# Altium schematic symbol library Capacitor - Aluminium TH.SchLib: 4591 symbols (part 16 of 27)
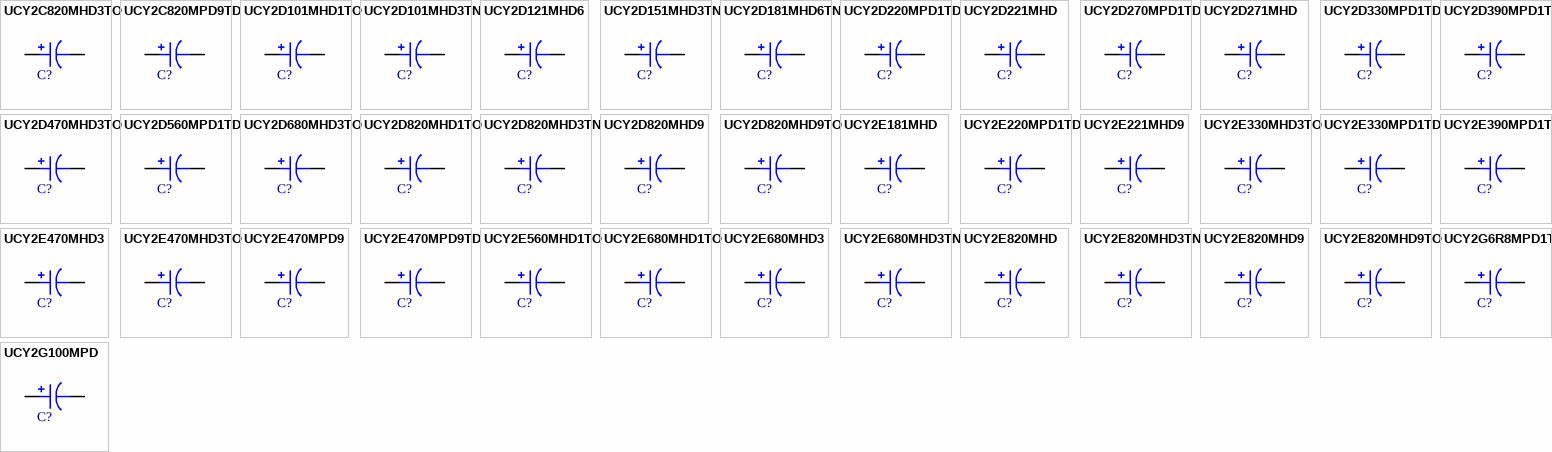
[diagram p129: symbols UCY2C820MHD3TO to UCY2G100MPD]

## UCY2D220MPD1TD
designator C?, comment 22uF  (value not drawn)
CAP ALUM 22UF 20% 200V RADIAL; Part Number: UCY2D220MPD1TD; Manufacturer: Nichicon; TemperatureRange: -40C ~ 105C; Type: Polar; Ripple Current: 225mA @ 120Hz; Value: 22uF; PartId: 25098; Supplier 1: Digi-Key; Supplier Part Number 1: 493-4803-3-ND; ComponentLink1Description: Datasheet; ComponentLink1URL: http://nichicon-us.com/english/products/pdfs/e-ucy.pdf; ComponentLink2Description: Digi-Key Listing; ComponentLink2URL: https://www.digikey.com/product-detail/en/nichicon/UCY2D220MPD1TD/493-4803-3-ND/3129808; Tolerance: 20%; Voltage: 200V; Price: 0.2793; Device Package: Radial, Can, 10mm
footprint CAP AL TH D10 L5 H17.5
pins: 1, 2

## UCY2D221MHD
designator C?, comment 220uF  (value not drawn)
CAP ALUM 220UF 20% 200V RADIAL; Part Number: UCY2D221MHD; Manufacturer: Nichicon; TemperatureRange: -40C ~ 105C; Type: Polar; Ripple Current: 1.23A @ 120Hz; Value: 220uF; PartId: 27200; Supplier 1: Digi-Key; Supplier Part Number 1: 493-5454-ND; ComponentLink1Description: Datasheet; ComponentLink1URL: http://nichicon-us.com/english/products/pdfs/e-ucy.pdf; ComponentLink2Description: Digi-Key Listing; ComponentLink2URL: https://www.digikey.com/product-detail/en/nichicon/UCY2D221MHD/493-5454-ND/2597700; Tolerance: 20%; Voltage: 200V; Price: 2.09; Device Package: Radial, Can, 16mm
footprint CAP AL TH D16 L7.5 H33.5
pins: 1, 2

## UCY2D270MPD1TD
designator C?, comment 27uF  (value not drawn)
CAP ALUM 27UF 20% 200V RADIAL; Part Number: UCY2D270MPD1TD; Manufacturer: Nichicon; TemperatureRange: -40C ~ 105C; Type: Polar; Ripple Current: 235mA @ 120Hz; Value: 27uF; PartId: 25108; Supplier 1: Digi-Key; Supplier Part Number 1: 493-4805-3-ND; ComponentLink1Description: Datasheet; ComponentLink1URL: http://nichicon-us.com/english/products/pdfs/e-ucy.pdf; ComponentLink2Description: Digi-Key Listing; ComponentLink2URL: https://www.digikey.com/product-detail/en/nichicon/UCY2D270MPD1TD/493-4805-3-ND/3129810; Tolerance: 20%; Voltage: 200V; Price: 0.2956; Device Package: Radial, Can, 10mm
footprint CAP AL TH D10 L5 H17.5
pins: 1, 2

## UCY2D271MHD
designator C?, comment 270uF  (value not drawn)
CAP ALUM 270UF 20% 200V RADIAL; Part Number: UCY2D271MHD; Manufacturer: Nichicon; TemperatureRange: -40C ~ 105C; Type: Polar; Ripple Current: 1.4A @ 120Hz; Value: 270uF; PartId: 27415; Supplier 1: Digi-Key; Supplier Part Number 1: 493-5455-ND; ComponentLink1Description: Datasheet; ComponentLink1URL: http://nichicon-us.com/english/products/pdfs/e-ucy.pdf; ComponentLink2Description: Digi-Key Listing; ComponentLink2URL: https://www.digikey.com/product-detail/en/nichicon/UCY2D271MHD/493-5455-ND/2597703; Tolerance: 20%; Voltage: 200V; Price: 2.51; Device Package: Radial, Can, 16mm
footprint CAP AL TH D16 L7.5 H37
pins: 1, 2

## UCY2D330MPD1TD
designator C?, comment 33uF  (value not drawn)
CAP ALUM 33UF 20% 200V RADIAL; Part Number: UCY2D330MPD1TD; Manufacturer: Nichicon; TemperatureRange: -40C ~ 105C; Type: Polar; Ripple Current: 305mA @ 120Hz; Value: 33uF; PartId: 25483; Supplier 1: Digi-Key; Supplier Part Number 1: 493-4806-3-ND; ComponentLink1Description: Datasheet; ComponentLink1URL: http://nichicon-us.com/english/products/pdfs/e-ucy.pdf; ComponentLink2Description: Digi-Key Listing; ComponentLink2URL: https://www.digikey.com/product-detail/en/nichicon/UCY2D330MPD1TD/493-4806-3-ND/3129811; Tolerance: 20%; Voltage: 200V; Price: 0.3332; Device Package: Radial, Can, 10mm
footprint CAP AL TH D10 L5 H22
pins: 1, 2

## UCY2D390MPD1TD
designator C?, comment 39uF  (value not drawn)
CAP ALUM 39UF 20% 200V RADIAL; Part Number: UCY2D390MPD1TD; Manufacturer: Nichicon; TemperatureRange: -40C ~ 105C; Type: Polar; Ripple Current: 325mA @ 120Hz; Value: 39uF; PartId: 25485; Supplier 1: Digi-Key; Supplier Part Number 1: 493-4807-3-ND; ComponentLink1Description: Datasheet; ComponentLink1URL: http://nichicon-us.com/english/products/pdfs/e-ucy.pdf; ComponentLink2Description: Digi-Key Listing; ComponentLink2URL: https://www.digikey.com/product-detail/en/nichicon/UCY2D390MPD1TD/493-4807-3-ND/3129812; Tolerance: 20%; Voltage: 200V; Price: 0.3411; Device Package: Radial, Can, 10mm
footprint CAP AL TH D10 L5 H22
pins: 1, 2

## UCY2D470MHD3TO
designator C?, comment 47uF  (value not drawn)
CAP ALUM 47UF 20% 200V RADIAL; Part Number: UCY2D470MHD3TO; Manufacturer: Nichicon; TemperatureRange: -40C ~ 105C; Type: Polar; Ripple Current: 490mA; Value: 47uF; PartId: 23033; Supplier 1: Digi-Key; Supplier Part Number 1: 493-4808-1-ND; ComponentLink1Description: Datasheet; ComponentLink1URL: http://nichicon-us.com/english/products/pdfs/e-ucy.pdf; ComponentLink2Description: Digi-Key Listing; ComponentLink2URL: https://www.digikey.com/product-detail/en/nichicon/UCY2D470MHD3TO/493-4808-1-ND/3129145; Tolerance: 20%; Voltage: 200V; Price: 0; Device Package: Radial, Can, 12.5mm
footprint CAP AL TH D12.5 L5 H21.5
pins: 1, 2

## UCY2D560MPD1TD
designator C?, comment 56uF  (value not drawn)
CAP ALUM 56UF 20% 200V RADIAL; Part Number: UCY2D560MPD1TD; Manufacturer: Nichicon; TemperatureRange: -40C ~ 105C; Type: Polar; Ripple Current: 415mA @ 120Hz; Value: 56uF; PartId: 26027; Supplier 1: Digi-Key; Supplier Part Number 1: 493-4809-3-ND; ComponentLink1Description: Datasheet; ComponentLink1URL: http://nichicon-us.com/english/products/pdfs/e-ucy.pdf; ComponentLink2Description: Digi-Key Listing; ComponentLink2URL: https://www.digikey.com/product-detail/en/nichicon/UCY2D560MPD1TD/493-4809-3-ND/3129814; Tolerance: 20%; Voltage: 200V; Price: 0.4253; Device Package: Radial, Can, 10mm
footprint CAP AL TH D10 L5 H30
pins: 1, 2

## UCY2D680MHD3TO
designator C?, comment 68uF  (value not drawn)
CAP ALUM 68UF 20% 200V RADIAL; Part Number: UCY2D680MHD3TO; Manufacturer: Nichicon; TemperatureRange: -40C ~ 105C; Type: Polar; Ripple Current: 650mA; Value: 68uF; PartId: 23035; Supplier 1: Digi-Key; Supplier Part Number 1: 493-4810-1-ND; ComponentLink1Description: Datasheet; ComponentLink1URL: http://nichicon-us.com/english/products/pdfs/e-ucy.pdf; ComponentLink2Description: Digi-Key Listing; ComponentLink2URL: https://www.digikey.com/product-detail/en/nichicon/UCY2D680MHD3TO/493-4810-1-ND/3129147; Tolerance: 20%; Voltage: 200V; Price: 0; Device Package: Radial, Can, 12.5mm
footprint CAP AL TH D12.5 L5 H21.5
pins: 1, 2

## UCY2D820MHD1TO
designator C?, comment 82uF  (value not drawn)
CAP ALUM 82UF 20% 200V RADIAL; Part Number: UCY2D820MHD1TO; Manufacturer: Nichicon; TemperatureRange: -40C ~ 105C; Type: Polar; Ripple Current: 645mA @ 120Hz; Value: 82uF; PartId: 23639; Supplier 1: Digi-Key; Supplier Part Number 1: 493-4811-3-ND; ComponentLink1Description: Datasheet; ComponentLink1URL: http://nichicon-us.com/english/products/pdfs/e-ucy.pdf; ComponentLink2Description: Digi-Key Listing; ComponentLink2URL: https://www.digikey.com/product-detail/en/nichicon/UCY2D820MHD1TO/493-4811-3-ND/3129816; Tolerance: 20%; Voltage: 200V; Price: 0.5819; Device Package: Radial, Can, 12.5mm
footprint CAP AL TH D12.5 L5 H26.5
pins: 1, 2

## UCY2D820MHD3TN
designator C?, comment 82uF  (value not drawn)
CAP ALUM 82UF 20% 200V RADIAL; Part Number: UCY2D820MHD3TN; Manufacturer: Nichicon; TemperatureRange: -40C ~ 105C; Type: Polar; Ripple Current: 690mA @ 120Hz; Value: 82uF; PartId: 26381; Supplier 1: Digi-Key; Supplier Part Number 1: 493-4812-3-ND; ComponentLink1Description: Datasheet; ComponentLink1URL: http://nichicon-us.com/english/products/pdfs/e-ucy.pdf; ComponentLink2Description: Digi-Key Listing; ComponentLink2URL: https://www.digikey.com/product-detail/en/nichicon/UCY2D820MHD3TN/493-4812-3-ND/3129817; Tolerance: 20%; Voltage: 200V; Price: 0.763; Device Package: Radial, Can, 16mm
footprint CAP AL TH D16 L7.5 H22
pins: 1, 2

## UCY2D820MHD9
designator C?, comment 82uF  (value not drawn)
CAP ALUM 82UF 20% 200V RADIAL; Part Number: UCY2D820MHD9; Manufacturer: Nichicon; TemperatureRange: -40C ~ 105C; Type: Polar; Ripple Current: 645mA @ 120Hz; Value: 82uF; PartId: 23034; Supplier 1: Digi-Key; Supplier Part Number 1: 493-6833-ND; ComponentLink1Description: Datasheet; ComponentLink1URL: http://nichicon-us.com/english/products/pdfs/e-ucy.pdf; ComponentLink2Description: Digi-Key Listing; ComponentLink2URL: https://www.digikey.com/product-detail/en/nichicon/UCY2D820MHD9/493-6833-ND/3664418; Tolerance: 20%; Voltage: 200V; Price: 0; Device Package: Radial, Can, 12.5mm
footprint CAP AL TH D12.5 L5 H21.5
pins: 1, 2

## UCY2D820MHD9TO
designator C?, comment 82uF  (value not drawn)
CAP ALUM 82UF 20% 200V RADIAL; Part Number: UCY2D820MHD9TO; Manufacturer: Nichicon; TemperatureRange: -40C ~ 105C; Type: Polar; Ripple Current: 645mA; Value: 82uF; PartId: 23048; Supplier 1: Digi-Key; Supplier Part Number 1: 493-13307-1-ND; ComponentLink1Description: Datasheet; ComponentLink1URL: http://nichicon-us.com/english/products/pdfs/e-ucy.pdf; ComponentLink2Description: Digi-Key Listing; ComponentLink2URL: https://www.digikey.com/product-detail/en/nichicon/UCY2D820MHD9TO/493-13307-1-ND/4333063; Tolerance: 20%; Voltage: 200V; Price: 0; Device Package: Radial, Can, 12.5mm
footprint CAP AL TH D12.5 L5 H21.5
pins: 1, 2

## UCY2E181MHD
designator C?, comment 180uF  (value not drawn)
CAP ALUM 180UF 20% 250V RADIAL; Part Number: UCY2E181MHD; Manufacturer: Nichicon; TemperatureRange: -40C ~ 105C; Type: Polar; Ripple Current: 1.11A @ 120Hz; Value: 180uF; PartId: 27242; Supplier 1: Digi-Key; Supplier Part Number 1: 493-13073-ND; ComponentLink1Description: Datasheet; ComponentLink1URL: http://nichicon-us.com/english/products/pdfs/e-ucy.pdf; ComponentLink2Description: Digi-Key Listing; ComponentLink2URL: https://www.digikey.com/product-detail/en/nichicon/UCY2E181MHD/493-13073-ND/2597722; Tolerance: 20%; Voltage: 250V; Price: 2.55; Device Package: Radial, Can, 16mm
footprint CAP AL TH D16 L7.5 H33.5
pins: 1, 2

## UCY2E220MPD1TD
designator C?, comment 22uF  (value not drawn)
CAP ALUM 22UF 20% 250V RADIAL; Part Number: UCY2E220MPD1TD; Manufacturer: Nichicon; TemperatureRange: -40C ~ 105C; Type: Polar; Ripple Current: 225mA @ 120Hz; Value: 22uF; PartId: 25110; Supplier 1: Digi-Key; Supplier Part Number 1: 493-13310-3-ND; ComponentLink1Description: Datasheet; ComponentLink1URL: http://nichicon-us.com/english/products/pdfs/e-ucy.pdf; ComponentLink2Description: Digi-Key Listing; ComponentLink2URL: https://www.digikey.com/product-detail/en/nichicon/UCY2E220MPD1TD/493-13310-3-ND/4332941; Tolerance: 20%; Voltage: 250V; Price: 0.3036; Device Package: Radial, Can, 10mm
footprint CAP AL TH D10 L5 H17.5
pins: 1, 2

## UCY2E221MHD9
designator C?, comment 220uF  (value not drawn)
CAP ALUM 220UF 20% 250V RADIAL; Part Number: UCY2E221MHD9; Manufacturer: Nichicon; TemperatureRange: -40C ~ 105C; Type: Polar; Ripple Current: 1.22A @ 120Hz; Value: 220uF; PartId: 27430; Supplier 1: Digi-Key; Supplier Part Number 1: 493-6855-ND; ComponentLink1Description: Datasheet; ComponentLink1URL: http://nichicon-us.com/english/products/pdfs/e-ucy.pdf; ComponentLink2Description: Digi-Key Listing; ComponentLink2URL: https://www.digikey.com/product-detail/en/nichicon/UCY2E221MHD9/493-6855-ND/3664454; Tolerance: 20%; Voltage: 250V; Price: 3.12; Device Package: Radial, Can, 16mm
footprint CAP AL TH D16 L7.5 H37
pins: 1, 2

## UCY2E330MHD3TO
designator C?, comment 33uF  (value not drawn)
CAP ALUM 33UF 20% 250V RADIAL; Part Number: UCY2E330MHD3TO; Manufacturer: Nichicon; TemperatureRange: -40C ~ 105C; Type: Polar; Ripple Current: 400mA; Value: 33uF; PartId: 23027; Supplier 1: Digi-Key; Supplier Part Number 1: 493-4816-1-ND; ComponentLink1Description: Datasheet; ComponentLink1URL: http://nichicon-us.com/english/products/pdfs/e-ucy.pdf; ComponentLink2Description: Digi-Key Listing; ComponentLink2URL: https://www.digikey.com/product-detail/en/nichicon/UCY2E330MHD3TO/493-4816-1-ND/3129153; Tolerance: 20%; Voltage: 250V; Price: 0; Device Package: Radial, Can, 12.5mm
footprint CAP AL TH D12.5 L5 H21.5
pins: 1, 2

## UCY2E330MPD1TD
designator C?, comment 33uF  (value not drawn)
CAP ALUM 33UF 20% 250V RADIAL; Part Number: UCY2E330MPD1TD; Manufacturer: Nichicon; TemperatureRange: -40C ~ 105C; Type: Polar; Ripple Current: 305mA @ 120Hz; Value: 33uF; PartId: 25486; Supplier 1: Digi-Key; Supplier Part Number 1: 493-4817-3-ND; ComponentLink1Description: Datasheet; ComponentLink1URL: http://nichicon-us.com/english/products/pdfs/e-ucy.pdf; ComponentLink2Description: Digi-Key Listing; ComponentLink2URL: https://www.digikey.com/product-detail/en/nichicon/UCY2E330MPD1TD/493-4817-3-ND/3129822; Tolerance: 20%; Voltage: 250V; Price: 0.3495; Device Package: Radial, Can, 10mm
footprint CAP AL TH D10 L5 H22
pins: 1, 2

## UCY2E390MPD1TD
designator C?, comment 39uF  (value not drawn)
CAP ALUM 39UF 20% 250V RADIAL; Part Number: UCY2E390MPD1TD; Manufacturer: Nichicon; TemperatureRange: -40C ~ 105C; Type: Polar; Ripple Current: 345mA @ 120Hz; Value: 39uF; PartId: 26029; Supplier 1: Digi-Key; Supplier Part Number 1: 493-4818-3-ND; ComponentLink1Description: Datasheet; ComponentLink1URL: http://nichicon-us.com/english/products/pdfs/e-ucy.pdf; ComponentLink2Description: Digi-Key Listing; ComponentLink2URL: https://www.digikey.com/product-detail/en/nichicon/UCY2E390MPD1TD/493-4818-3-ND/3129823; Tolerance: 20%; Voltage: 250V; Price: 0.441; Device Package: Radial, Can, 10mm
footprint CAP AL TH D10 L5 H30
pins: 1, 2

## UCY2E470MHD3
designator C?, comment 47uF  (value not drawn)
CAP ALUM 47UF 20% 250V RADIAL; Part Number: UCY2E470MHD3; Manufacturer: Nichicon; TemperatureRange: -40C ~ 105C; Type: Polar; Ripple Current: 490mA @ 120Hz; Value: 47uF; PartId: 23031; Supplier 1: Digi-Key; Supplier Part Number 1: 493-14381-ND; ComponentLink1Description: Datasheet; ComponentLink1URL: http://nichicon-us.com/english/products/pdfs/e-ucy.pdf; ComponentLink2Description: Digi-Key Listing; ComponentLink2URL: https://www.digikey.com/product-detail/en/nichicon/UCY2E470MHD3/493-14381-ND/2539807; Tolerance: 20%; Voltage: 250V; Price: 0; Device Package: Radial, Can, 12.5mm
footprint CAP AL TH D12.5 L5 H21.5
pins: 1, 2

## UCY2E470MHD3TO
designator C?, comment 47uF  (value not drawn)
CAP ALUM 47UF 20% 250V RADIAL; Part Number: UCY2E470MHD3TO; Manufacturer: Nichicon; TemperatureRange: -40C ~ 105C; Type: Polar; Ripple Current: 490mA; Value: 47uF; PartId: 23043; Supplier 1: Digi-Key; Supplier Part Number 1: 493-4819-1-ND; ComponentLink1Description: Datasheet; ComponentLink1URL: http://nichicon-us.com/english/products/pdfs/e-ucy.pdf; ComponentLink2Description: Digi-Key Listing; ComponentLink2URL: https://www.digikey.com/product-detail/en/nichicon/UCY2E470MHD3TO/493-4819-1-ND/3129156; Tolerance: 20%; Voltage: 250V; Price: 0; Device Package: Radial, Can, 12.5mm
footprint CAP AL TH D12.5 L5 H21.5
pins: 1, 2

## UCY2E470MPD9
designator C?, comment 47uF  (value not drawn)
CAP ALUM 47UF 20% 250V RADIAL; Part Number: UCY2E470MPD9; Manufacturer: Nichicon; TemperatureRange: -40C ~ 105C; Type: Polar; Ripple Current: 345mA @ 120Hz; Value: 47uF; PartId: 26182; Supplier 1: Digi-Key; Supplier Part Number 1: 493-6919-ND; ComponentLink1Description: Datasheet; ComponentLink1URL: http://nichicon-us.com/english/products/pdfs/e-ucy.pdf; ComponentLink2Description: Digi-Key Listing; ComponentLink2URL: https://www.digikey.com/product-detail/en/nichicon/UCY2E470MPD9/493-6919-ND/3664437; Tolerance: 20%; Voltage: 250V; Price: 1.01; Device Package: Radial, Can, 10mm
footprint CAP AL TH D10 L5 H30
pins: 1, 2

## UCY2E470MPD9TD
designator C?, comment 47uF  (value not drawn)
CAP ALUM 47UF 20% 250V RADIAL; Part Number: UCY2E470MPD9TD; Manufacturer: Nichicon; TemperatureRange: -40C ~ 105C; Type: Polar; Ripple Current: 345mA @ 120Hz; Value: 47uF; PartId: 26034; Supplier 1: Digi-Key; Supplier Part Number 1: 493-13093-3-ND; ComponentLink1Description: Datasheet; ComponentLink1URL: http://nichicon-us.com/english/products/pdfs/e-ucy.pdf; ComponentLink2Description: Digi-Key Listing; ComponentLink2URL: https://www.digikey.com/product-detail/en/nichicon/UCY2E470MPD9TD/493-13093-3-ND/4332724; Tolerance: 20%; Voltage: 250V; Price: 0.4522; Device Package: Radial, Can, 10mm
footprint CAP AL TH D10 L5 H30
pins: 1, 2

## UCY2E560MHD1TO
designator C?, comment 56uF  (value not drawn)
CAP ALUM 56UF 20% 250V RADIAL; Part Number: UCY2E560MHD1TO; Manufacturer: Nichicon; TemperatureRange: -40C ~ 105C; Type: Polar; Ripple Current: 515mA; Value: 56uF; PartId: 23052; Supplier 1: Digi-Key; Supplier Part Number 1: 493-4820-1-ND; ComponentLink1Description: Datasheet; ComponentLink1URL: http://nichicon-us.com/english/products/pdfs/e-ucy.pdf; ComponentLink2Description: Digi-Key Listing; ComponentLink2URL: https://www.digikey.com/product-detail/en/nichicon/UCY2E560MHD1TO/493-4820-1-ND/3129157; Tolerance: 20%; Voltage: 250V; Price: 0; Device Package: Radial, Can, 12.5mm
footprint CAP AL TH D12.5 L5 H21.5
pins: 1, 2

## UCY2E680MHD1TO
designator C?, comment 68uF  (value not drawn)
CAP ALUM 68UF 20% 250V RADIAL; Part Number: UCY2E680MHD1TO; Manufacturer: Nichicon; TemperatureRange: -40C ~ 105C; Type: Polar; Ripple Current: 615mA @ 120Hz; Value: 68uF; PartId: 23640; Supplier 1: Digi-Key; Supplier Part Number 1: 493-4821-3-ND; ComponentLink1Description: Datasheet; ComponentLink1URL: http://nichicon-us.com/english/products/pdfs/e-ucy.pdf; ComponentLink2Description: Digi-Key Listing; ComponentLink2URL: https://www.digikey.com/product-detail/en/nichicon/UCY2E680MHD1TO/493-4821-3-ND/3129826; Tolerance: 20%; Voltage: 250V; Price: 0.6082; Device Package: Radial, Can, 12.5mm
footprint CAP AL TH D12.5 L5 H26.5
pins: 1, 2

## UCY2E680MHD3
designator C?, comment 68uF  (value not drawn)
CAP ALUM 68UF 20% 250V RADIAL; Part Number: UCY2E680MHD3; Manufacturer: Nichicon; TemperatureRange: -40C ~ 105C; Type: Polar; Ripple Current: 650mA @ 120Hz; Value: 68uF; PartId: 26467; Supplier 1: Digi-Key; Supplier Part Number 1: 493-5932-ND; ComponentLink1Description: Datasheet; ComponentLink1URL: http://nichicon-us.com/english/products/pdfs/e-ucy.pdf; ComponentLink2Description: Digi-Key Listing; ComponentLink2URL: https://www.digikey.com/product-detail/en/nichicon/UCY2E680MHD3/493-5932-ND/2539808; Tolerance: 20%; Voltage: 250V; Price: 1.56; Device Package: Radial, Can, 16mm
footprint CAP AL TH D16 L7.5 H22
pins: 1, 2

## UCY2E680MHD3TN
designator C?, comment 68uF  (value not drawn)
CAP ALUM 68UF 20% 250V RADIAL; Part Number: UCY2E680MHD3TN; Manufacturer: Nichicon; TemperatureRange: -40C ~ 105C; Type: Polar; Ripple Current: 650mA @ 120Hz; Value: 68uF; PartId: 26390; Supplier 1: Digi-Key; Supplier Part Number 1: 493-4822-3-ND; ComponentLink1Description: Datasheet; ComponentLink1URL: http://nichicon-us.com/english/products/pdfs/e-ucy.pdf; ComponentLink2Description: Digi-Key Listing; ComponentLink2URL: https://www.digikey.com/product-detail/en/nichicon/UCY2E680MHD3TN/493-4822-3-ND/3129827; Tolerance: 20%; Voltage: 250V; Price: 0.8188; Device Package: Radial, Can, 16mm
footprint CAP AL TH D16 L7.5 H22
pins: 1, 2

## UCY2E820MHD
designator C?, comment 82uF  (value not drawn)
CAP ALUM 82UF 20% 250V RADIAL; Part Number: UCY2E820MHD; Manufacturer: Nichicon; TemperatureRange: -40C ~ 105C; Type: Polar; Ripple Current: 715mA @ 120Hz; Value: 82uF; PartId: 24374; Supplier 1: Digi-Key; Supplier Part Number 1: 493-5464-ND; ComponentLink1Description: Datasheet; ComponentLink1URL: http://nichicon-us.com/english/products/pdfs/e-ucy.pdf; ComponentLink2Description: Digi-Key Listing; ComponentLink2URL: https://www.digikey.com/product-detail/en/nichicon/UCY2E820MHD/493-5464-ND/2597734; Tolerance: 20%; Voltage: 250V; Price: 1.62; Device Package: Radial, Can, 12.5mm
footprint CAP AL TH D12.5 L5 H35.5
pins: 1, 2

## UCY2E820MHD3TN
designator C?, comment 82uF  (value not drawn)
CAP ALUM 82UF 20% 250V RADIAL; Part Number: UCY2E820MHD3TN; Manufacturer: Nichicon; TemperatureRange: -40C ~ 105C; Type: Polar; Ripple Current: 690mA @ 120Hz; Value: 82uF; PartId: 26396; Supplier 1: Digi-Key; Supplier Part Number 1: 493-4823-3-ND; ComponentLink1Description: Datasheet; ComponentLink1URL: http://nichicon-us.com/english/products/pdfs/e-ucy.pdf; ComponentLink2Description: Digi-Key Listing; ComponentLink2URL: https://www.digikey.com/product-detail/en/nichicon/UCY2E820MHD3TN/493-4823-3-ND/3129828; Tolerance: 20%; Voltage: 250V; Price: 0.8566; Device Package: Radial, Can, 16mm
footprint CAP AL TH D16 L7.5 H22
pins: 1, 2

## UCY2E820MHD9
designator C?, comment 82uF  (value not drawn)
CAP ALUM 82UF 20% 250V RADIAL; Part Number: UCY2E820MHD9; Manufacturer: Nichicon; TemperatureRange: -40C ~ 105C; Type: Polar; Ripple Current: 615mA @ 120Hz; Value: 82uF; PartId: 23739; Supplier 1: Digi-Key; Supplier Part Number 1: 493-6899-ND; ComponentLink1Description: Datasheet; ComponentLink1URL: http://nichicon-us.com/english/products/pdfs/e-ucy.pdf; ComponentLink2Description: Digi-Key Listing; ComponentLink2URL: https://www.digikey.com/product-detail/en/nichicon/UCY2E820MHD9/493-6899-ND/3664486; Tolerance: 20%; Voltage: 250V; Price: 1.55; Device Package: Radial, Can, 12.5mm
footprint CAP AL TH D12.5 L5 H26.5
pins: 1, 2

## UCY2E820MHD9TO
designator C?, comment 82uF  (value not drawn)
CAP ALUM 82UF 20% 250V RADIAL; Part Number: UCY2E820MHD9TO; Manufacturer: Nichicon; TemperatureRange: -40C ~ 105C; Type: Polar; Ripple Current: 615mA @ 120Hz; Value: 82uF; PartId: 23645; Supplier 1: Digi-Key; Supplier Part Number 1: 493-13312-3-ND; ComponentLink1Description: Datasheet; ComponentLink1URL: http://nichicon-us.com/english/products/pdfs/e-ucy.pdf; ComponentLink2Description: Digi-Key Listing; ComponentLink2URL: https://www.digikey.com/product-detail/en/nichicon/UCY2E820MHD9TO/493-13312-3-ND/4332943; Tolerance: 20%; Voltage: 250V; Price: 0.6934; Device Package: Radial, Can, 12.5mm
footprint CAP AL TH D12.5 L5 H26.5
pins: 1, 2

## UCY2G6R8MPD1TD
designator C?, comment 6.8uF  (value not drawn)
CAP ALUM 6.8UF 20% 400V RADIAL; Part Number: UCY2G6R8MPD1TD; Manufacturer: Nichicon; TemperatureRange: -40C ~ 105C; Type: Polar; Ripple Current: 140mA @ 120Hz; Value: 6.8uF; PartId: 25099; Supplier 1: Digi-Key; Supplier Part Number 1: 493-13319-3-ND; ComponentLink1Description: Datasheet; ComponentLink1URL: http://nichicon-us.com/english/products/pdfs/e-ucy.pdf; ComponentLink2Description: Digi-Key Listing; ComponentLink2URL: https://www.digikey.com/product-detail/en/nichicon/UCY2G6R8MPD1TD/493-13319-3-ND/4332950; Tolerance: 20%; Voltage: 400V; Price: 0.2806; Device Package: Radial, Can, 10mm
footprint CAP AL TH D10 L5 H17.5
pins: 1, 2

## UCY2G100MPD
designator C?, comment 10uF  (value not drawn)
CAP ALUM 10UF 20% 400V RADIAL; Part Number: UCY2G100MPD; Manufacturer: Nichicon; TemperatureRange: -40C ~ 105C; Type: Polar; Ripple Current: 150mA @ 120Hz; Value: 10uF; PartId: 25401; Supplier 1: Digi-Key; Supplier Part Number 1: 493-13387-ND; ComponentLink1Description: Datasheet; ComponentLink1URL: http://nichicon-us.com/english/products/pdfs/e-ucy.pdf; ComponentLink2Description: Digi-Key Listing; ComponentLink2URL: https://www.digikey.com/product-detail/en/nichicon/UCY2G100MPD/493-13387-ND/2597735; Tolerance: 20%; Voltage: 400V; Price: 0.8; Device Package: Radial, Can, 10mm
footprint CAP AL TH D10 L5 H17.5
pins: 1, 2

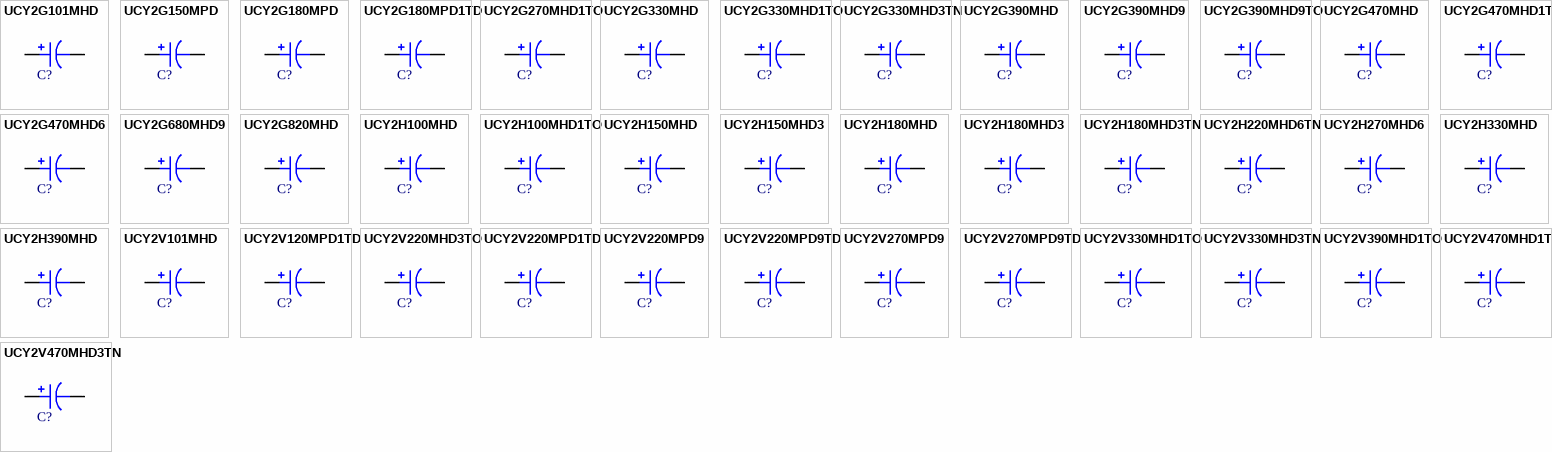
[diagram p65: symbols UCY2G101MHD to UCY2V470MHD3TN]

## UCY2G101MHD
designator C?, comment 100uF  (value not drawn)
CAP ALUM 100UF 20% 400V RADIAL; Part Number: UCY2G101MHD; Manufacturer: Nichicon; TemperatureRange: -40C ~ 105C; Type: Polar; Ripple Current: 850mA @ 120Hz; Value: 100uF; PartId: 27434; Supplier 1: Digi-Key; Supplier Part Number 1: 493-13075-ND; ComponentLink1Description: Datasheet; ComponentLink1URL: http://nichicon-us.com/english/products/pdfs/e-ucy.pdf; ComponentLink2Description: Digi-Key Listing; ComponentLink2URL: https://www.digikey.com/product-detail/en/nichicon/UCY2G101MHD/493-13075-ND/2597736; Tolerance: 20%; Voltage: 400V; Price: 3.28; Device Package: Radial, Can, 16mm
footprint CAP AL TH D16 L7.5 H37
pins: 1, 2

## UCY2G150MPD
designator C?, comment 15uF  (value not drawn)
CAP ALUM 15UF 20% 400V RADIAL; Part Number: UCY2G150MPD; Manufacturer: Nichicon; TemperatureRange: -40C ~ 105C; Type: Polar; Ripple Current: 180mA @ 120Hz; Value: 15uF; PartId: 25701; Supplier 1: Digi-Key; Supplier Part Number 1: 493-14460-ND; ComponentLink1Description: Datasheet; ComponentLink1URL: http://nichicon-us.com/english/products/pdfs/e-ucy.pdf; ComponentLink2Description: Digi-Key Listing; ComponentLink2URL: https://www.digikey.com/product-detail/en/nichicon/UCY2G150MPD/493-14460-ND/2597740; Tolerance: 20%; Voltage: 400V; Price: 0.87; Device Package: Radial, Can, 10mm
footprint CAP AL TH D10 L5 H22
pins: 1, 2

## UCY2G180MPD
designator C?, comment 18uF  (value not drawn)
CAP ALUM 18UF 20% 400V RADIAL; Part Number: UCY2G180MPD; Manufacturer: Nichicon; TemperatureRange: -40C ~ 105C; Type: Polar; Ripple Current: 235mA @ 120Hz; Value: 18uF; PartId: 26179; Supplier 1: Digi-Key; Supplier Part Number 1: 493-14461-ND; ComponentLink1Description: Datasheet; ComponentLink1URL: http://nichicon-us.com/english/products/pdfs/e-ucy.pdf; ComponentLink2Description: Digi-Key Listing; ComponentLink2URL: https://www.digikey.com/product-detail/en/nichicon/UCY2G180MPD/493-14461-ND/2597742; Tolerance: 20%; Voltage: 400V; Price: 0.99; Device Package: Radial, Can, 10mm
footprint CAP AL TH D10 L5 H30
pins: 1, 2

## UCY2G180MPD1TD
designator C?, comment 18uF  (value not drawn)
CAP ALUM 18UF 20% 400V RADIAL; Part Number: UCY2G180MPD1TD; Manufacturer: Nichicon; TemperatureRange: -40C ~ 105C; Type: Polar; Ripple Current: 235mA @ 120Hz; Value: 18uF; PartId: 26030; Supplier 1: Digi-Key; Supplier Part Number 1: 493-4824-3-ND; ComponentLink1Description: Datasheet; ComponentLink1URL: http://nichicon-us.com/english/products/pdfs/e-ucy.pdf; ComponentLink2Description: Digi-Key Listing; ComponentLink2URL: https://www.digikey.com/product-detail/en/nichicon/UCY2G180MPD1TD/493-4824-3-ND/3129829; Tolerance: 20%; Voltage: 400V; Price: 0.4428; Device Package: Radial, Can, 10mm
footprint CAP AL TH D10 L5 H30
pins: 1, 2

## UCY2G270MHD1TO
designator C?, comment 27uF  (value not drawn)
CAP ALUM 27UF 20% 400V RADIAL; Part Number: UCY2G270MHD1TO; Manufacturer: Nichicon; TemperatureRange: -40C ~ 105C; Type: Polar; Ripple Current: 360mA; Value: 27uF; PartId: 23056; Supplier 1: Digi-Key; Supplier Part Number 1: 493-4825-1-ND; ComponentLink1Description: Datasheet; ComponentLink1URL: http://nichicon-us.com/english/products/pdfs/e-ucy.pdf; ComponentLink2Description: Digi-Key Listing; ComponentLink2URL: https://www.digikey.com/product-detail/en/nichicon/UCY2G270MHD1TO/493-4825-1-ND/3129162; Tolerance: 20%; Voltage: 400V; Price: 0; Device Package: Radial, Can, 12.5mm
footprint CAP AL TH D12.5 L5 H21.5
pins: 1, 2

## UCY2G330MHD
designator C?, comment 33uF  (value not drawn)
CAP ALUM 33UF 20% 400V RADIAL; Part Number: UCY2G330MHD; Manufacturer: Nichicon; TemperatureRange: -40C ~ 105C; Type: Polar; Ripple Current: 385mA @ 120Hz; Value: 33uF; PartId: 23747; Supplier 1: Digi-Key; Supplier Part Number 1: 493-14462-ND; ComponentLink1Description: Datasheet; ComponentLink1URL: http://nichicon-us.com/english/products/pdfs/e-ucy.pdf; ComponentLink2Description: Digi-Key Listing; ComponentLink2URL: https://www.digikey.com/product-detail/en/nichicon/UCY2G330MHD/493-14462-ND/2597746; Tolerance: 20%; Voltage: 400V; Price: 1.67; Device Package: Radial, Can, 12.5mm
footprint CAP AL TH D12.5 L5 H26.5
pins: 1, 2

## UCY2G330MHD1TO
designator C?, comment 33uF  (value not drawn)
CAP ALUM 33UF 20% 400V RADIAL; Part Number: UCY2G330MHD1TO; Manufacturer: Nichicon; TemperatureRange: -40C ~ 105C; Type: Polar; Ripple Current: 385mA @ 120Hz; Value: 33uF; PartId: 23648; Supplier 1: Digi-Key; Supplier Part Number 1: 493-13316-3-ND; ComponentLink1Description: Datasheet; ComponentLink1URL: http://nichicon-us.com/english/products/pdfs/e-ucy.pdf; ComponentLink2Description: Digi-Key Listing; ComponentLink2URL: https://www.digikey.com/product-detail/en/nichicon/UCY2G330MHD1TO/493-13316-3-ND/4332947; Tolerance: 20%; Voltage: 400V; Price: 0.7475; Device Package: Radial, Can, 12.5mm
footprint CAP AL TH D12.5 L5 H26.5
pins: 1, 2

## UCY2G330MHD3TN
designator C?, comment 33uF  (value not drawn)
CAP ALUM 33UF 20% 400V RADIAL; Part Number: UCY2G330MHD3TN; Manufacturer: Nichicon; TemperatureRange: -40C ~ 105C; Type: Polar; Ripple Current: 450mA @ 120Hz; Value: 33uF; PartId: 26398; Supplier 1: Digi-Key; Supplier Part Number 1: 493-4826-3-ND; ComponentLink1Description: Datasheet; ComponentLink1URL: http://nichicon-us.com/english/products/pdfs/e-ucy.pdf; ComponentLink2Description: Digi-Key Listing; ComponentLink2URL: https://www.digikey.com/product-detail/en/nichicon/UCY2G330MHD3TN/493-4826-3-ND/3129831; Tolerance: 20%; Voltage: 400V; Price: 0.9045; Device Package: Radial, Can, 16mm
footprint CAP AL TH D16 L7.5 H22
pins: 1, 2

## UCY2G390MHD
designator C?, comment 39uF  (value not drawn)
CAP ALUM 39UF 20% 400V RADIAL; Part Number: UCY2G390MHD; Manufacturer: Nichicon; TemperatureRange: -40C ~ 105C; Type: Polar; Ripple Current: 465mA @ 120Hz; Value: 39uF; PartId: 24387; Supplier 1: Digi-Key; Supplier Part Number 1: 493-5469-ND; ComponentLink1Description: Datasheet; ComponentLink1URL: http://nichicon-us.com/english/products/pdfs/e-ucy.pdf; ComponentLink2Description: Digi-Key Listing; ComponentLink2URL: https://www.digikey.com/product-detail/en/nichicon/UCY2G390MHD/493-5469-ND/2597747; Tolerance: 20%; Voltage: 400V; Price: 1.74; Device Package: Radial, Can, 12.5mm
footprint CAP AL TH D12.5 L5 H35.5
pins: 1, 2

## UCY2G390MHD9
designator C?, comment 39uF  (value not drawn)
CAP ALUM 39UF 20% 400V RADIAL; Part Number: UCY2G390MHD9; Manufacturer: Nichicon; TemperatureRange: -40C ~ 105C; Type: Polar; Ripple Current: 385mA @ 120Hz; Value: 39uF; PartId: 23760; Supplier 1: Digi-Key; Supplier Part Number 1: 493-6980-ND; ComponentLink1Description: Datasheet; ComponentLink1URL: http://nichicon-us.com/english/products/pdfs/e-ucy.pdf; ComponentLink2Description: Digi-Key Listing; ComponentLink2URL: https://www.digikey.com/product-detail/en/nichicon/UCY2G390MHD9/493-6980-ND/3664469; Tolerance: 20%; Voltage: 400V; Price: 1.77; Device Package: Radial, Can, 12.5mm
footprint CAP AL TH D12.5 L5 H26.5
pins: 1, 2

## UCY2G390MHD9TO
designator C?, comment 39uF  (value not drawn)